# Altium schematic symbol library IC_ADI.SCHLIB: 3169 symbols (part 129 of 181) (continued)
## AD8522AR (continued)

## AD8522ARZ
designator U?
Dual 12-Bit Digital-to-Analog Converter with Serial Interface, 5 V, -40 to +85 degC, R-14, Pb-Free, Tube; Generic Part Number: AD8522; PartNumber: AD8522ARZ; # DAC Outputs: 2; Max V+: 5.5V; Op Pwr Diss: 25mW; Resolution (Bits): 12; Settling Time: 16祍; Single Supply: Yes; DatasheetVersion: Rev.A; PackageVersion: 060606-A; PackageReference: R-14; PackageDescription: 14-Lead Standard Small Outline Package [SOIC_N]; Supplier Part Number 1: AD8522ARZ-ND; Supplier Part Number 2: 2305694; Supplier Part Number 3: 59K6799; Supplier Part Number 4: 584-AD8522ARZ; Packing: Tube; RoHS: Y; Mounting Technology: Surface Mount; Code_JEDEC: MS-012-AB; Code_IPC: SOIC127P600-14; ComponentLink1Description: Manufacturer URL; ComponentLink2Description: Datasheet; ComponentLink3Description: Package Specification; ComponentLink4Description: Product URL
footprint SOIC14_1.27 (Footprint not found)
pins: 1 VOUTA (out) "DAC A voltage outputs, 4.095 V full scale, +/-5 mA output.", 2 AGND (power) "Analog Ground Input.", 3 DGND (power) "Digital Ground Input.", 4 ~{CS} (in) "Chip Select, active low input. Prevents shift register loading when high. Does not affect L\D\A\ and L\D\B\ operation.", 5 CLK (in) "Clock input, positive edge clocks data into shift register.", 6 SDI (in) "Serial Data Input, input data loads directly into the shift register.", 7 SDO (out) "Serial Data Output. Output of shift register, always active.", 8 ~{LDB} (in) "Load DAC register strobes, active low. Transfers shift register data to DAC register. See truth table for operation.Software decode feature only requires one L\D\ strobe. Tie L\D\A\ and L\D\B\ together or use one of them (See Datasheet)", 9 ~{LDA} (in) "Load DAC register strobes, active low. Transfers shift register data to DAC register. See truth table for operation.Software decode feature only requires one L\D\ strobe. Tie L\D\A\ and L\D\B\ together or use one of them (See Datasheet)", 10 ~{RS} (in) "Resets DAC registers to condition determined by MSB pin. Active low input.", 11 MSB (in) "Digital input: High presets DAC registers to half scale (800H); Low clears all registers to zero (000H), when R\S\ is strobed to active low.", 12 VDD (power) "Positive +5 V power supply input. Tolerance +/-10%.", 13 VREF (out) "Reference Voltage Output, 2.5 V nominal.", 14 VOUTB (out) "DAC B voltage outputs, 4.095 V full scale, +/-5 mA output."

## AD8531AKSZ-R2
designator U?
Single Channel RRIO Operational Amplifier, 3 MHz BW, 5 V/us SR, Industrial, 5-pin SOT23 (KS-5), Reel; Generic Part Number: AD8531; PartNumber: AD8531AKSZ-R2; Amplifiers Per Package: 1; Input Bias Current: 5pA; Input Offset Voltage: 25mV; Iq/Amp: 1.25mA; Slew Rate: 5V/us; Small Signal Bandwidth: 3MHz; V Span Max: 6V; V Span Min: 2.7V; DatasheetVersion: Rev. F; PackageVersion: 072809-A; PackageReference: KS-5; PackageDescription: 5-Pin Thin Shrink Small Outline Transistor Package, Body 2 x 1.25 mm, Pitch 0.65 mm; Supplier Part Number 1: AD8531AKSZ-R2-ND; Supplier Part Number 2: 59K6810; Packing: Reel; Mounting Technology: Surface Mount; Code_JEDEC: MO-203-AA; ComponentLink1Description: Manufacturer URL; ComponentLink2Description: Datasheet; ComponentLink3Description: Package Specification
footprint SOT353 (Footprint not found)
pins: 1 OUT A (out), 2 -V (power), 3 +IN A (in), 4 -IN A (in), 5 +V (power)

## AD8532AR
designator U?
Double Channel Rail-to-Rail Operational Amplifier, 3 MHz BW, 5 V/us SR, Industrial, 8-pin SOIC (R-8), Tube; Generic Part Number: AD8532; PartNumber: AD8532AR; Amplifiers Per Package: 2; Input Bias Current: 5pA; Input Offset Voltage: 25mV; Iq/Amp: 1.25mA; Slew Rate: 5V/us; Small Signal Bandwidth: 3MHz; V Span Max: 6V; V Span Min: 3V; DatasheetVersion: Rev. F; PackageVersion: 060506-A; PackageReference: R-8; PackageDescription: 8-Pin Standard Small Outline Package, Body 3.9 x 4.9 mm, Pitch 1.27 mm; Supplier Part Number 1: AD8532AR-ND; Mounting Technology: Surface Mount; Code_JEDEC: MS-012-AA; ComponentLink1Description: Manufacturer URL; ComponentLink2Description: Datasheet; ComponentLink3Description: Package Specification
footprint SOIC8_1.27 (Footprint not found)
pins on every part: 4 -V (power), 8 +V (power)
part A pins: 1 OUT A (out), 2 -IN A (in), 3 +IN A (in)
part B pins: 5 +IN B (in), 6 -IN B (in), 7 OUT B (out)

## AD8532ARMZ-R2
designator U?
Double Channel Rail-to-Rail Operational Amplifier, 3 MHz BW, 5 V/us SR, Industrial, 8-pin SOP (RM-8), Reel; Generic Part Number: AD8532; PartNumber: AD8532ARMZ-R2; Amplifiers Per Package: 2; Input Bias Current: 5pA; Input Offset Voltage: 25mV; Iq/Amp: 1.25mA; Slew Rate: 5V/us; Small Signal Bandwidth: 3MHz; V Span Max: 6V; V Span Min: 3V; DatasheetVersion: Rev. F; PackageReference: RM-8; PackageDescription: 8-Pin Mini Small Outline Package, Body 3 x 3 mm, Pitch 0.65 mm; Supplier Part Number 1: AD8532ARMZ-R2TR-ND; Supplier Part Number 2: AD8532ARMZ-R2CT-ND; Supplier Part Number 3: AD8532ARMZ-R2DKR-ND; Supplier Part Number 4: 1699534; Supplier Part Number 5: 12M9106; Mounting Technology: Surface Mount; Code_JEDEC: MO-187-AA; ComponentLink1Description: Manufacturer URL; ComponentLink2Description: Datasheet; ComponentLink3Description: Package Specification
footprint VSSOP8_0.65 (Footprint not found)
pins on every part: 4 -V (power), 8 +V (power)
part A pins: 1 OUT A (out), 2 -IN A (in), 3 +IN A (in)
part B pins: 5 +IN B (in), 6 -IN B (in), 7 OUT B (out)

## AD8538AUJZ-R2
designator U?
Single Channel Single-Supply Operation Operational Amplifier, 430 KHz BW, 400 mV/us SR, Industrial, 5-pin SOT23 (UJ-5), Reel; Generic Part Number: AD8538; PartNumber: AD8538AUJZ-R2; Amplifiers Per Package: 1; Input Bias Current: 15pA; Input Offset Voltage: 5uV; Iq/Amp: 180uA; Small Signal Bandwidth: 430KHz; V Span Max: 5.5V; V Span Min: 2.7V; DatasheetVersion: Rev. A; PackageVersion: 100708-A; PackageReference: UJ-5; PackageDescription: 5-Pin Thin Small Outline Transistor Package, Body 2.9 x 1.6 mm, Pitch 0.95 mm; Supplier Part Number 1: AD8538AUJZ-R2-ND; Supplier Part Number 2: 1699535; Supplier Part Number 3: 12M9112; Slew Rate: 400mV/us; Mounting Technology: Surface Mount; Code_JEDEC: MO-193-AB; ComponentLink1Description: Manufacturer URL; ComponentLink2Description: Datasheet; ComponentLink3Description: Package Specification
footprint SOT23-5 (Footprint not found)
pins: 1 OUT (out), 2 -V (power), 3 +IN (in), 4 -IN (in), 5 +V (power)

## AD8541AKSZ-R2
designator U?
Single Channel RRIO Operational Amplifier, 1 MHz BW, 920 mV/us SR, Industrial, 5-pin SOT23 (KS-5), Reel; Generic Part Number: AD8541; PartNumber: AD8541AKSZ-R2; Amplifiers Per Package: 1; Input Bias Current: 4pA; Input Offset Voltage: 1mV; Iq/Amp: 65uA; Small Signal Bandwidth: 1MHz; V Span Max: 5.5V; V Span Min: 2.7V; DatasheetVersion: Rev. G; PackageVersion: 072809-A; PackageReference: KS-5; PackageDescription: 5-Pin Thin Shrink Small Outline Transistor Package, Body 2 x 1.25 mm, Pitch 0.65 mm; Supplier Part Number 1: AD8541AKSZ-R2TR-ND; Supplier Part Number 2: AD8541AKSZ-R2CT-ND; Supplier Part Number 3: AD8541AKSZ-R2DKR-ND; Supplier Part Number 4: 1837433; Supplier Part Number 5: 59K6819; Slew Rate: 920mV/us; Mounting Technology: Surface Mount; Code_JEDEC: MO-203-AA; ComponentLink1Description: Manufacturer URL; ComponentLink2Description: Datasheet; ComponentLink3Description: Package Specification; ComponentLink4Description: Reference Circuit
footprint SOT353 (Footprint not found)
pins: 1 OUT A (out), 2 -V (power), 3 +IN A (in), 4 -IN A (in), 5 +V (power)

## AD8541ARTZ-R2
designator U?
Single Channel RRIO Operational Amplifier, 1 MHz BW, 920 mV/us SR, Industrial, 5-pin SOT23 (RJ-5), Reel; Generic Part Number: AD8541; PartNumber: AD8541ARTZ-R2; Amplifiers Per Package: 1; Input Bias Current: 4pA; Input Offset Voltage: 1mV; Iq/Amp: 65uA; Small Signal Bandwidth: 1MHz; V Span Max: 5.5V; V Span Min: 2.7V; DatasheetVersion: Rev. G; PackageVersion: 121608-A; PackageReference: RJ-5; PackageDescription: 5-Pin Small Outline Transistor Package, Body 2.9 x 1.6 mm, Pitch 0.95 mm; Supplier Part Number 1: AD8541ARTZ-R2TR-ND; Supplier Part Number 2: AD8541ARTZ-R2CT-ND; Supplier Part Number 3: AD8541ARTZ-R2DKR-ND; Supplier Part Number 4: 1837434; Supplier Part Number 5: 59K6820; Slew Rate: 920mV/us; Mounting Technology: Surface Mount; Code_JEDEC: MO-178-AA; ComponentLink1Description: Manufacturer URL; ComponentLink2Description: Datasheet; ComponentLink3Description: Package Specification; ComponentLink4Description: Reference Circuit
footprint SOT23-5 (Footprint not found)
pins: 1 OUT A (out), 2 -V (power), 3 +IN A (in), 4 -IN A (in), 5 +V (power)

## AD8542ARMZ
designator U?
Double Channel RRIO Operational Amplifier, 1 MHz BW, 920 mV/us SR, Industrial, 8-pin SOP (RM-8), Tube; Generic Part Number: AD8542; PartNumber: AD8542ARMZ; Amplifiers Per Package: 2; Input Bias Current: 4pA; Input Offset Voltage: 1mV; Iq/Amp: 65uA; Small Signal Bandwidth: 1MHz; V Span Max: 5.5V; V Span Min: 2.7V; DatasheetVersion: Rev. G; PackageReference: RM-8; PackageDescription: 8-Pin Mini Small Outline Package, Body 3 x 3 mm, Pitch 0.65 mm; Supplier Part Number 1: AD8542ARMZ-ND; Supplier Part Number 2: 34P3244; Slew Rate: 920mV/us; Mounting Technology: Surface Mount; Code_JEDEC: MO-187-AA; ComponentLink1Description: Manufacturer URL; ComponentLink2Description: Datasheet; ComponentLink3Description: Package Specification
footprint VSSOP8_0.65 (Footprint not found)
pins on every part: 4 -V (power), 8 +V (power)
part A pins: 1 OUT A (out), 2 -IN A (in), 3 +IN A (in)
part B pins: 5 +IN B (in), 6 -IN B (in), 7 OUT B (out)

## AD8551ARMZ
designator U?
Single Channel Rail-to-Rail Operational Amplifier, 1.5 MHz BW, 400 mV/us SR, Industrial, 8-pin SOP (RM-8), Tube; Generic Part Number: AD8551; PartNumber: AD8551ARMZ; Amplifiers Per Package: 1; Input Bias Current: 10pA; Input Offset Voltage: 1uV; Iq/Amp: 975礎; Small Signal Bandwidth: 1.5MHz; V Span Max: 6V; V Span Min: 2.7V; DatasheetVersion: Rev. E; PackageReference: RM-8; PackageDescription: 8-Pin Mini Small Outline Package, Body 3 x 3 mm, Pitch 0.65 mm; Supplier Part Number 1: AD8551ARMZ-ND; Supplier Part Number 2: 19P8302; Slew Rate: 400mV/us; Mounting Technology: Surface Mount; Code_JEDEC: MO-187-AA; ComponentLink1Description: Manufacturer URL; ComponentLink2Description: Datasheet; ComponentLink3Description: Package Specification
footprint VSSOP8_0.65 (Footprint not found)
part A pins: 2 -IN A (in), 3 +IN A (in), 4 -V (power), 6 OUT A (out), 7 +V (power)
part B pins: 1 NC, 5 NC, 8 NC

## AD8552AR
designator U?
Double Channel Rail-to-Rail Operational Amplifier, 1.5 MHz BW, 400 mV/us SR, Industrial, 8-pin SOIC (R-8), Tube; Generic Part Number: AD8552; PartNumber: AD8552AR; Amplifiers Per Package: 2; Input Bias Current: 10pA; Input Offset Voltage: 1uV; Iq/Amp: 975uA; Small Signal Bandwidth: 1.5MHz; V Span Max: 5.5V; V Span Min: 2.7V; DatasheetVersion: Rev. E; PackageVersion: 060506-A; PackageReference: R-8; PackageDescription: 8-Pin Standard Small Outline Package, Body 3.9 x 4.9 mm, Pitch 1.27 mm; Supplier Part Number 1: AD8552AR-ND; Slew Rate: 400mV/us; Mounting Technology: Surface Mount; Code_JEDEC: MS-012-AA; ComponentLink1Description: Manufacturer URL; ComponentLink2Description: Datasheet; ComponentLink3Description: Package Specification
footprint SOIC8_1.27 (Footprint not found)
pins on every part: 4 -V (power), 8 +V (power)
part A pins: 1 OUT A (out), 2 -IN A (in), 3 +IN A (in)
part B pins: 5 +IN B (in), 6 -IN B (in), 7 OUT B (out)

## AD8552ARU
designator U?
Double Channel Rail-to-Rail Operational Amplifier, 1.5 MHz BW, 400 mV/us SR, Industrial, 8-pin SOP (RU-8), Tube; Generic Part Number: AD8552; PartNumber: AD8552ARU; Amplifiers Per Package: 2; Input Bias Current: 10pA; Input Offset Voltage: 1uV; Iq/Amp: 975uA; Small Signal Bandwidth: 1.5MHz; V Span Max: 5.5V; V Span Min: 2.7V; DatasheetVersion: Rev. E; PackageReference: RU-8; PackageDescription: 8-Pin Thin Shrink Small Outline Package, Body 3 x 4.4 mm, Pitch 0.65 mm; Supplier Part Number 1: AD8552ARU-ND; Slew Rate: 400mV/us; Mounting Technology: Surface Mount; Code_JEDEC: MO-153AA; ComponentLink1Description: Manufacturer URL; ComponentLink2Description: Datasheet; ComponentLink3Description: Package Specification
footprint TSSOP8_0.65 (Footprint not found)
pins on every part: 4 -V (power), 8 +V (power)
part A pins: 1 OUT A (out), 2 -IN A (in), 3 +IN A (in)
part B pins: 5 +IN B (in), 6 -IN B (in), 7 OUT B (out)

## AD8561AN
designator U?
Ultrafast Single Supply Comparator, 5 V, 7 ns Delay, Industrial, 8-pin DIP (N-8), Tube; PartNumber: AD8561AN; Input Range (V): -5 to 3; Total Power (mW): 65mW; Voltage Supply (V): +/- 5; DatasheetVersion: Rev. 0; PackageVersion: 070606-A, 07/2006; PackageReference: N-8; PackageDescription: 8-Pin Plastic Dual In-Line Package, Row spacing 7.62 mm, Pitch 2.54 mm; Supplier Part Number 1: AD8561AN-ND; Supplier Part Number 2: N/A; Packing: Tube; Mounting Technology: Through Hole; Code_JEDEC: MS-001; ComponentLink1Description: Manufacturer URL; ComponentLink2Description: Datasheet; ComponentLink3Description: Package Specification; ComponentLink4Description: URL Link1
footprint DIP8 (Footprint not found)
pins: 1 V+ (power), 2 +IN (in), 3 -IN (in), 4 V- (power), 5 LATCH (in), 6 GND (power), 7 OUT (out), 8 ~{OUT} (out)

## AD8561AR
designator U?
Ultrafast Single Supply Comparator, 5 V, 7 ns Delay, Industrial, 8-pin SOIC (R-8), Tube; PartNumber: AD8561AR; Input Range (V): -5 to 3; Total Power (mW): 65mW; Voltage Supply (V): +/- 5; DatasheetVersion: Rev. 0; PackageVersion: 060506-A, 06/2006; PackageReference: R-8; PackageDescription: 8-Pin Standard Small Outline Package, Body 4.9 x 3.9 mm, Pitch 1.27 mm; Supplier Part Number 1: AD8561AR-ND; Supplier Part Number 2: 584-AD8561AR; Packing: Tube; Mounting Technology: Surface Mount; Code_JEDEC: MS-012-AA; ComponentLink1Description: Manufacturer URL; ComponentLink2Description: Datasheet; ComponentLink3Description: Package Specification; ComponentLink4Description: URL Link1
footprint SOIC8_1.27 (Footprint not found)
pins: 1 V+ (power), 2 +IN (in), 3 -IN (in), 4 V- (power), 5 LATCH (in), 6 GND (power), 7 OUT (out), 8 ~{OUT} (out)

## AD8561ARUZ
designator U?
Ultrafast Single Supply Comparator, 5 V, 7 ns Delay, Industrial, 8-pin SOP (RU-8), Tube; PartNumber: AD8561ARUZ; Input Range (V): -5 to 3; Total Power (mW): 65mW; Voltage Supply (V): +/- 5; DatasheetVersion: Rev. 0; PackageVersion: Jan-03; PackageReference: RU-8; PackageDescription: 8-Pin Thin Shrink Small Outline Package, Body 3 x 4.4 mm, Pitch 0.65 mm; Supplier Part Number 1: AD8561ARUZ-ND; Supplier Part Number 2: 2305660; Supplier Part Number 3: 584-AD8561ARUZ; Packing: Tube; Mounting Technology: Surface Mount; Code_JEDEC: MO-153AA; ComponentLink1Description: Manufacturer URL; ComponentLink2Description: Datasheet; ComponentLink3Description: Package Specification; ComponentLink4Description: URL Link1
footprint TSSOP8_0.65 (Footprint not found)
pins: 1 V+ (power), 2 +IN (in), 3 -IN (in), 4 V- (power), 5 LATCH (in), 6 GND (power), 7 OUT (out), 8 ~{OUT} (out)

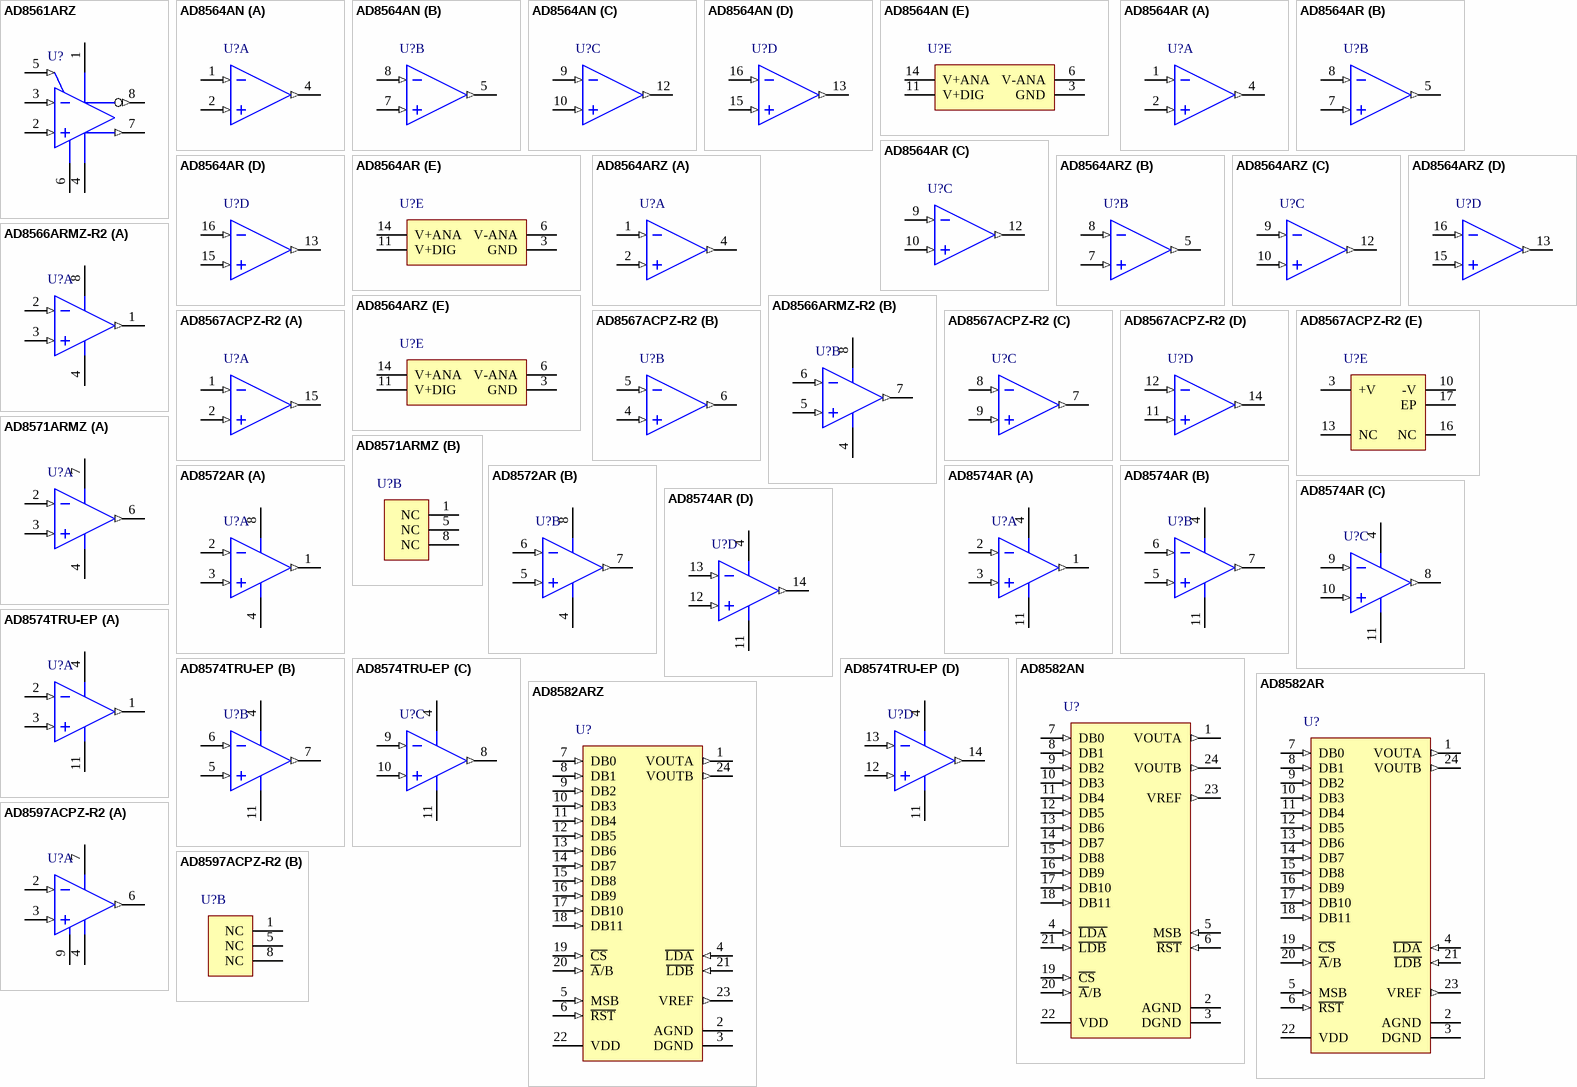
[diagram p96: symbols AD8561ARZ to AD8597ACPZ-R2]

## AD8561ARZ
designator U?
Ultrafast Single Supply Comparator, 5 V, 7 ns Delay, Industrial, 8-pin SOIC (R-8), Tube; PartNumber: AD8561ARZ; Input Range (V): -5 to 3; Total Power (mW): 65mW; Voltage Supply (V): +/- 5; DatasheetVersion: Rev. 0; PackageVersion: 060506-A, 06/2006; PackageReference: R-8; PackageDescription: 8-Pin Standard Small Outline Package, Body 4.9 x 3.9 mm, Pitch 1.27 mm; Supplier Part Number 1: AD8561ARZ-ND; Supplier Part Number 2: 1661043; Supplier Part Number 3: 584-AD8561ARZ; Packing: Tube; Mounting Technology: Surface Mount; Code_JEDEC: MS-012-AA; ComponentLink1Description: Manufacturer URL; ComponentLink2Description: Datasheet; ComponentLink3Description: Package Specification; ComponentLink4Description: URL Link1
footprint SOIC8_1.27 (Footprint not found)
pins: 1 V+ (power), 2 +IN (in), 3 -IN (in), 4 V- (power), 5 LATCH (in), 6 GND (power), 7 OUT (out), 8 ~{OUT} (out)

## AD8564AN
designator U?
Quad Single Supply Comparator, 5 V, 7 ns Delay, Industrial, 16-pin DIP (N-16), Tube; PartNumber: AD8564AN; Input Range (V): -4.9 to 3.5; Total Power (mW): 150mW; Voltage Supply (V): +/- 5; DatasheetVersion: Rev. B; PackageVersion: 070706-A, 07/2006; PackageReference: N-16; PackageDescription: 16-Pin Plastic Dual In-Line Package, Row spacing 7.62 mm, Pitch 2.54 mm; Supplier Part Number 1: AD8564AN-ND; Supplier Part Number 2: N/A; Packing: Tube; Mounting Technology: Through Hole; Code_JEDEC: MS-001; ComponentLink1Description: Manufacturer URL; ComponentLink2Description: Datasheet; ComponentLink3Description: Package Specification; ComponentLink4Description: URL Link1
footprint DIP16 (Footprint not found)
part A pins: 1 -INA (in), 2 +INA (in), 4 OUT A (out)
part B pins: 5 OUT B (out), 7 +INB (in), 8 -INB (in)
part C pins: 9 -INC (in), 10 +INC (in), 12 OUT C (out)
part D pins: 13 OUT D (out), 15 +IND (in), 16 -IND (in)
part E pins: 3 GND (power), 6 V-ANA (power), 11 V+DIG (power), 14 V+ANA (power)

## AD8564AR
designator U?
Quad Single Supply Comparator, 5 V, 7 ns Delay, Industrial, 16-pin SOIC (R-16), Tube; PartNumber: AD8564AR; Input Range (V): -4.9 to 3.5; Total Power (mW): 150mW; Voltage Supply (V): +/- 5; DatasheetVersion: Rev. B; PackageVersion: 060606-A, 06/2006; PackageReference: R-16; PackageDescription: 16-Pin Standard Small Outline Package, Body 9.9 x 3.9 mm, Pitch 1.27 mm; Supplier Part Number 1: AD8564AR-ND; Supplier Part Number 2: 584-AD8564AR; Packing: Tube; Mounting Technology: Surface Mount; Code_JEDEC: MS-012-AC; ComponentLink1Description: Manufacturer URL; ComponentLink2Description: Datasheet; ComponentLink3Description: Package Specification; ComponentLink4Description: URL Link1
footprint SOIC16_1.27 (Footprint not found)
part A pins: 1 -INA (in), 2 +INA (in), 4 OUT A (out)
part B pins: 5 OUT B (out), 7 +INB (in), 8 -INB (in)
part C pins: 9 -INC (in), 10 +INC (in), 12 OUT C (out)
part D pins: 13 OUT D (out), 15 +IND (in), 16 -IND (in)
part E pins: 3 GND (power), 6 V-ANA (power), 11 V+DIG (power), 14 V+ANA (power)

## AD8564ARZ
designator U?
Quad Single Supply Comparator, 5 V, 7 ns Delay, Industrial, 16-pin SOIC (R-16), Tube; PartNumber: AD8564ARZ; Input Range (V): -4.9 to 3.5; Total Power (mW): 150mW; Voltage Supply (V): +/- 5; DatasheetVersion: Rev. B; PackageVersion: 060606-A, 06/2006; PackageReference: R-16; PackageDescription: 16-Pin Standard Small Outline Package, Body 9.9 x 3.9 mm, Pitch 1.27 mm; Supplier Part Number 1: AD8564ARZ-ND; Supplier Part Number 2: 1661044; Supplier Part Number 3: 584-AD8564ARZ; Packing: Tube; Mounting Technology: Surface Mount; Code_JEDEC: MS-012-AC; ComponentLink1Description: Manufacturer URL; ComponentLink2Description: Datasheet; ComponentLink3Description: Package Specification; ComponentLink4Description: URL Link1
footprint SOIC16_1.27 (Footprint not found)
part A pins: 1 -INA (in), 2 +INA (in), 4 OUT A (out)
part B pins: 5 OUT B (out), 7 +INB (in), 8 -INB (in)
part C pins: 9 -INC (in), 10 +INC (in), 12 OUT C (out)
part D pins: 13 OUT D (out), 15 +IND (in), 16 -IND (in)
part E pins: 3 GND (power), 6 V-ANA (power), 11 V+DIG (power), 14 V+ANA (power)

## AD8566ARMZ-R2
designator U?
Double Channel Single-Supply Operation Operational Amplifier, 5 MHz BW, 6 V/us SR, Industrial, 8-pin SOP (RM-8), Reel; Generic Part Number: AD8566; PartNumber: AD8566ARMZ-R2; Amplifiers Per Package: 2; Automotive Qualified: Yes; Input Bias Current: 600nA; Input Offset Voltage: 2mV; Iq/Amp: 850uA; Slew Rate: 6V/us; Small Signal Bandwidth: 5MHz; V Span Max: 16V; V Span Min: 4.5V; DatasheetVersion: Rev. G; PackageReference: RM-8; PackageDescription: 8-Pin Mini Small Outline Package, Body 3 x 3 mm, Pitch 0.65 mm; Supplier Part Number 1: AD8566ARMZ-R2TR-ND; Supplier Part Number 2: AD8566ARMZ-R2CT-ND; Supplier Part Number 3: AD8566ARMZ-R2DKR-ND; Supplier Part Number 4: 12M9118; Mounting Technology: Surface Mount; Code_JEDEC: MO-187-AA; ComponentLink1Description: Manufacturer URL; ComponentLink2Description: Datasheet; ComponentLink3Description: Package Specification
footprint VSSOP8_0.65 (Footprint not found)
pins on every part: 4 -V (power), 8 +V (power)
part A pins: 1 OUT A (out), 2 -IN A (in), 3 +IN A (in)
part B pins: 5 +IN B (in), 6 -IN B (in), 7 OUT B (out)

## AD8567ACPZ-R2
designator U?
Quad Channel Rail-to-Rail Operational Amplifier, 5 MHz BW, 6 V/us SR, Industrial, 16-pin QFN (CP-16-4), Reel; Generic Part Number: AD8567; PartNumber: AD8567ACPZ-R2; Amplifiers Per Package: 4; Input Bias Current: 80nA; Input Offset Voltage: 2mV; Iq/Amp: 850礎; Slew Rate: 6V/us; Small Signal Bandwidth: 5MHz; V Span Max: 16V; V Span Min: 4.5V; DatasheetVersion: Rev. G; PackageVersion: 010606-0; PackageReference: CP-16-4; PackageDescription: 16-Pin Lead Frame Chip Scale Package, Body 4 x 4 mm, Pitch 0.65 mm; Supplier Part Number 1: AD8567ACPZ-R2-ND; Supplier Part Number 2: 59K6867; Mounting Technology: Surface Mount; Code_JEDEC: MO-220-VGGC; ComponentLink1Description: Manufacturer URL; ComponentLink2Description: Datasheet; ComponentLink3Description: Package Specification
footprint QFN16_0.65-PAD(4x4) (Footprint not found)
part A pins: 1 -IN A (in), 2 +IN A (in), 15 OUT A (out)
part B pins: 4 +IN B (in), 5 -IN B (in), 6 OUT B (out)
part C pins: 7 OUT C (out), 8 -IN C (in), 9 +IN C (in)
part D pins: 11 +IN D (in), 12 -IN D (in), 14 OUT D (out)
part E pins: 3 +V (power), 10 -V (power), 13 NC, 16 NC, 17 EP (power) "IT IS RECOMMENDED TO CONNECT THE EXPOSED PAD TO V-."

## AD8571ARMZ
designator U?
Single Channel Rail-to-Rail Operational Amplifier, 1.5 MHz BW, 400 mV/us SR, Industrial, 8-pin SOP (RM-8), Tube; Generic Part Number: AD8571; PartNumber: AD8571ARMZ; Amplifiers Per Package: 1; Input Bias Current: 10pA; Input Offset Voltage: 1uV; Iq/Amp: 975礎; Small Signal Bandwidth: 1.5MHz; V Span Max: 6V; V Span Min: 2.7V; DatasheetVersion: Rev. E; PackageReference: RM-8; PackageDescription: 8-Pin Mini Small Outline Package, Body 3 x 3 mm, Pitch 0.65 mm; Supplier Part Number 1: AD8571ARMZ-ND; Slew Rate: 400mV/us; Mounting Technology: Surface Mount; Code_JEDEC: MO-187-AA; ComponentLink1Description: Manufacturer URL; ComponentLink2Description: Datasheet; ComponentLink3Description: Package Specification
footprint VSSOP8_0.65 (Footprint not found)
part A pins: 2 -IN A (in), 3 +IN A (in), 4 -V (power), 6 OUT A (out), 7 +V (power)
part B pins: 1 NC, 5 NC, 8 NC

## AD8572AR
designator U?
Double Channel Rail-to-Rail Operational Amplifier, 1.5 MHz BW, 400 mV/us SR, Industrial, 8-pin SOIC (R-8), Tube; Generic Part Number: AD8572; PartNumber: AD8572AR; Amplifiers Per Package: 2; Input Bias Current: 10pA; Input Offset Voltage: 1uV; Iq/Amp: 975uA; Small Signal Bandwidth: 1.5MHz; V Span Max: 6V; V Span Min: 2.7V; DatasheetVersion: Rev. E; PackageVersion: 060506-A; PackageReference: R-8; PackageDescription: 8-Pin Standard Small Outline Package, Body 3.9 x 4.9 mm, Pitch 1.27 mm; Supplier Part Number 1: AD8572AR-ND; Slew Rate: 400mV/us; Mounting Technology: Surface Mount; Code_JEDEC: MS-012-AA; ComponentLink1Description: Manufacturer URL; ComponentLink2Description: Datasheet; ComponentLink3Description: Package Specification
footprint SOIC8_1.27 (Footprint not found)
pins on every part: 4 -V (power), 8 +V (power)
part A pins: 1 OUT A (out), 2 -IN A (in), 3 +IN A (in)
part B pins: 5 +IN B (in), 6 -IN B (in), 7 OUT B (out)

## AD8574AR
designator U?
Quad Channel Rail-to-Rail Operational Amplifier, 1.5 MHz BW, 400 mV/us SR, Industrial, 14-pin SOIC (R-14), Tube; Generic Part Number: AD8574; PartNumber: AD8574AR; Amplifiers Per Package: 4; Input Bias Current: 10pA; Input Offset Voltage: 1uV; Iq/Amp: 975uA; Small Signal Bandwidth: 1.5MHz; V Span Max: 6V; V Span Min: 2.7V; DatasheetVersion: Rev. E; PackageVersion: 060606-A; PackageReference: R-14; PackageDescription: 14-Pin Standard Small Outline Package, Body 8.65 x 3.9 mm, Pitch 1.27 mm; Supplier Part Number 1: AD8574AR-ND; Slew Rate: 400mV/us; Mounting Technology: Surface Mount; Code_JEDEC: MS-012-AB; ComponentLink1Description: Manufacturer URL; ComponentLink2Description: Datasheet; ComponentLink3Description: Package Specification
footprint SOIC14_1.27 (Footprint not found)
pins on every part: 4 +V (power), 11 -V (power)
part A pins: 1 OUT A (out), 2 -IN A (in), 3 +IN A (in)
part B pins: 5 +IN B (in), 6 -IN B (in), 7 OUT B (out)
part C pins: 8 OUT C (out), 9 -IN C (in), 10 +IN C (in)
part D pins: 12 +IN D (in), 13 -IN D (in), 14 OUT D (out)

## AD8574TRU-EP
designator U?
Quad Channel RRIO Operational Amplifier, 1.5 MHz BW, 400 mV/us SR, Military, 14-pin SOP (RU-14), Tube; Generic Part Number: AD8574; PartNumber: AD8574TRU-EP; Amplifiers Per Package: 4; Input Bias Current: 10pA; Input Offset Voltage: 1uV; Iq/Amp: 975uA; Small Signal Bandwidth: 1.5MHz; V Span Max: 6V; V Span Min: 2.7V; DatasheetVersion: Rev. E; PackageReference: RU-14; PackageDescription: 14-Pin Thin Shrink Small Outline Package, Body 5 x 4.4 mm, Pitch 0.65 mm; Supplier Part Number 1: AD8574TRU-EP-ND; Supplier Part Number 2: 45T0238; Slew Rate: 400mV/us; Mounting Technology: Surface Mount; Code_JEDEC: MO-153AB-1; ComponentLink1Description: Manufacturer URL; ComponentLink2Description: Datasheet; ComponentLink3Description: Package Specification
footprint TSSOP14_0.65 (Footprint not found)
pins on every part: 4 +V (power), 11 -V (power)
part A pins: 1 OUT A (out), 2 -IN A (in), 3 +IN A (in)
part B pins: 5 +IN B (in), 6 -IN B (in), 7 OUT B (out)
part C pins: 8 OUT C (out), 9 -IN C (in), 10 +IN C (in)
part D pins: 12 +IN D (in), 13 -IN D (in), 14 OUT D (out)

## AD8582AN
designator U?
Dual 12-Bit Digital-to-Analog Converter with Parallel Interface, 5 V, -40 to +85 degC, N-24-1, Tube; Generic Part Number: AD8582; PartNumber: AD8582AN; # DAC Outputs: 2; Max V+: 5.25V; Op Pwr Diss: 35mW; Resolution (Bits): 12; Settling Time: 16祍; Single Supply: Yes; DatasheetVersion: Rev.0; PackageVersion: 071006-A; PackageReference: N-24-1; PackageDescription: 24-Lead Plastic Dual In-Line Package [PDIP] Narrow Body; Supplier Part Number 1: AD8582AN-ND; Supplier Part Number 2: 584-AD8582AN; Packing: Tube; RoHS: N; Mounting Technology: Through Hole; Code_JEDEC: MS-001; ComponentLink1Description: Manufacturer URL; ComponentLink2Description: Datasheet; ComponentLink3Description: Package Specification; ComponentLink4Description: Product URL
footprint DIP24 (Footprint not found)
pins: 1 VOUTA (out) "Voltage outputs from the DACs. Fixed output voltage range of 0 V to 4.095 V with 1 mV/LSB. An internal temperature stabilized reference maintains a fixed full-scale voltage independent of time, temperature and power supply (See Datasheet)", 2 AGND (power) "Analog Ground. Ground reference for the internal bandgap reference voltage, the DAC, and the output buffer.", 3 DGND (power) "Digital ground for input logic.", 4 ~{LDA} (in) "Load DAC register strobes. Transfers input register data to the DAC registers. Active low inputs, Level sensitive latch. May be connected together to doublebuffer load DAC registers.", 5 MSB (in) "Digital Input: High presets DAC registers to half scale (800H), Low clears DAC registers to zero (000H) upon R\S\T\ assertion.", 6 ~{RST} (in) "Active low digital input that clears the DAC register to zero, setting the DAC to minimum scale when MSB pin = 0, or half-scale when MSB pin = 1.", 7 DB0 (in) "Binary Data Bit Input. DB0 is the LSB.", 8 DB1 (in) "Binary Data Bit Input.", 9 DB2 (in) "Binary Data Bit Input.", 10 DB3 (in) "Binary Data Bit Input.", 11 DB4 (in) "Binary Data Bit Input.", 12 DB5 (in) "Binary Data Bit Input.", 13 DB6 (in) "Binary Data Bit Input.", 14 DB7 (in) "Binary Data Bit Input.", 15 DB8 (in) "Binary Data Bit Input.", 16 DB9 (in) "Binary Data Bit Input.", 17 DB10 (in) "Binary Data Bit Input.", 18 DB11 (in) "Binary Data Bit Input.DB11 is the MSB .", 19 ~{CS} (in) "Chip Select. Active low input.", 20 ~{A}/B (in) "Select DAC A = 0 or DAC B = 1.", 21 ~{LDB} (in) "Load DAC register strobes. Transfers input register data to the DAC registers. Active low inputs, Level sensitive latch. May be connected together to doublebuffer load DAC registers.", 22 VDD (power) "Positive Supply. Nominal value +5 V, +/-5%.", 23 VREF (out) "Nominal 2.5 V reference output voltage. This node must be buffered if required to drive external loads.", 24 VOUTB (out) "Voltage outputs from the DACs. Fixed output voltage range of 0 V to 4.095 V with 1 mV/LSB. An internal temperature stabilized reference maintains a fixed full-scale voltage independent of time, temperature and power supply (See Datasheet)"

## AD8582AR
designator U?
Dual 12-Bit Digital-to-Analog Converter with Parallel Interface, 5 V, -40 to +85 degC, RW-24, Tube; Generic Part Number: AD8582; PartNumber: AD8582AR; # DAC Outputs: 2; Max V+: 5.25V; Op Pwr Diss: 35mW; Resolution (Bits): 12; Settling Time: 16祍; Single Supply: Yes; DatasheetVersion: Rev.0; PackageVersion: 060706-A; PackageReference: RW-24; PackageDescription: 24-Lead Standard Small Outline Package [SOIC_W]; Supplier Part Number 1: AD8582AR-ND; Supplier Part Number 2: 584-AD8582AR; Packing: Tube; RoHS: N; Mounting Technology: Surface Mount; Code_JEDEC: MS-013-AD; ComponentLink1Description: Manufacturer URL; ComponentLink2Description: Datasheet; ComponentLink3Description: Package Specification; ComponentLink4Description: Product URL
footprint SOIC24W_1.27 (Footprint not found)
pins: 1 VOUTA (out) "Voltage outputs from the DACs. Fixed output voltage range of 0 V to 4.095 V with 1 mV/LSB. An internal temperature stabilized reference maintains a fixed full-scale voltage independent of time, temperature and power supply (See Datasheet)", 2 AGND (power) "Analog Ground. Ground reference for the internal bandgap reference voltage, the DAC, and the output buffer.", 3 DGND (power) "Digital ground for input logic.", 4 ~{LDA} (in) "Load DAC register strobes. Transfers input register data to the DAC registers. Active low inputs, Level sensitive latch. May be connected together to doublebuffer load DAC registers.", 5 MSB (in) "Digital Input: High presets DAC registers to half scale (800H), Low clears DAC registers to zero (000H) upon R\S\T\ assertion.", 6 ~{RST} (in) "Active low digital input that clears the DAC register to zero, setting the DAC to minimum scale when MSB pin = 0, or half-scale when MSB pin = 1.", 7 DB0 (in) "Twelve Binary Data Bit Input.  DB0 is the LSB.", 8 DB1 (in) "Twelve Binary Data Bit Input.", 9 DB2 (in) "Twelve Binary Data Bit Input.", 10 DB3 (in) "Twelve Binary Data Bit Input.", 11 DB4 (in) "Twelve Binary Data Bit Input.", 12 DB5 (in) "Twelve Binary Data Bit Input.", 13 DB6 (in) "Twelve Binary Data Bit Input.", 14 DB7 (in) "Twelve Binary Data Bit Input.", 15 DB8 (in) "Twelve Binary Data Bit Input.", 16 DB9 (in) "Twelve Binary Data Bit Input.", 17 DB10 (in) "Twelve Binary Data Bit Input.", 18 DB11 (in) "Twelve Binary Data Bit Input. DB11 is the MSB.", 19 ~{CS} (in) "Chip Select. Active low input.", 20 ~{A}/B (in) "Select DAC A = 0 or DAC B = 1.", 21 ~{LDB} (in) "Load DAC register strobes. Transfers input register data to the DAC registers. Active low inputs, Level sensitive latch. May be connected together to doublebuffer load DAC registers.", 22 VDD (power) "Positive Supply. Nominal value +5 V, +/-5%.", 23 VREF (out) "Nominal 2.5 V reference output voltage. This node must be buffered if required to drive external loads.", 24 VOUTB (out) "Voltage outputs from the DACs. Fixed output voltage range of 0 V to 4.095 V with 1 mV/LSB. An internal temperature stabilized reference maintains a fixed full-scale voltage independent of time, temperature and power supply (See Datasheet)"

## AD8582ARZ
designator U?
Dual 12-Bit Digital-to-Analog Converter with Parallel Interface, 5 V, -40 to +85 degC, RW-24, Pb-Free, Tube; Generic Part Number: AD8582; PartNumber: AD8582ARZ; # DAC Outputs: 2; Max V+: 5.25V; Op Pwr Diss: 35mW; Resolution (Bits): 12; Settling Time: 16祍; Single Supply: Yes; DatasheetVersion: Rev.0; PackageVersion: 060706-A; PackageReference: RW-24; PackageDescription: 24-Lead Standard Small Outline Package [SOIC_W]; Supplier Part Number 1: AD8582ARZ-ND; Supplier Part Number 2: 59K6880; Supplier Part Number 3: 584-AD8582ARZ; Packing: Tube; RoHS: Y; Mounting Technology: Surface Mount; Code_JEDEC: MS-013-AD; ComponentLink1Description: Manufacturer URL; ComponentLink2Description: Datasheet; ComponentLink3Description: Package Specification; ComponentLink4Description: Product URL
footprint SOIC24W_1.27 (Footprint not found)
pins: 1 VOUTA (out) "Voltage outputs from the DACs. Fixed output voltage range of 0 V to 4.095 V with 1 mV/LSB. An internal temperature stabilized reference maintains a fixed full-scale voltage independent of time, temperature and power supply (See Datasheet)", 2 AGND (power) "Analog Ground. Ground reference for the internal bandgap reference voltage, the DAC, and the output buffer.", 3 DGND (power) "Digital ground for input logic.", 4 ~{LDA} (in) "Load DAC register strobes. Transfers input register data to the DAC registers. Active low inputs, Level sensitive latch. May be connected together to doublebuffer load DAC registers.", 5 MSB (in) "Digital Input: High presets DAC registers to half scale (800H), Low clears DAC registers to zero (000H) upon R\S\T\ assertion.", 6 ~{RST} (in) "Active low digital input that clears the DAC register to zero, setting the DAC to minimum scale when MSB pin = 0, or half-scale when MSB pin = 1.", 7 DB0 (in) "Twelve Binary Data Bit Input.  DB0 is the LSB.", 8 DB1 (in) "Twelve Binary Data Bit Input.", 9 DB2 (in) "Twelve Binary Data Bit Input.", 10 DB3 (in) "Twelve Binary Data Bit Input.", 11 DB4 (in) "Twelve Binary Data Bit Input.", 12 DB5 (in) "Twelve Binary Data Bit Input.", 13 DB6 (in) "Twelve Binary Data Bit Input.", 14 DB7 (in) "Twelve Binary Data Bit Input.", 15 DB8 (in) "Twelve Binary Data Bit Input.", 16 DB9 (in) "Twelve Binary Data Bit Input.", 17 DB10 (in) "Twelve Binary Data Bit Input.", 18 DB11 (in) "Twelve Binary Data Bit Input. DB11 is the MSB.", 19 ~{CS} (in) "Chip Select. Active low input.", 20 ~{A}/B (in) "Select DAC A = 0 or DAC B = 1.", 21 ~{LDB} (in) "Load DAC register strobes. Transfers input register data to the DAC registers. Active low inputs, Level sensitive latch. May be connected together to doublebuffer load DAC registers.", 22 VDD (power) "Positive Supply. Nominal value +5 V, +/-5%.", 23 VREF (out) "Nominal 2.5 V reference output voltage. This node must be buffered if required to drive external loads.", 24 VOUTB (out) "Voltage outputs from the DACs. Fixed output voltage range of 0 V to 4.095 V with 1 mV/LSB. An internal temperature stabilized reference maintains a fixed full-scale voltage independent of time, temperature and power supply (See Datasheet)"

## AD8597ACPZ-R2
designator U?
Single Channel Wide Bandwidth Operational Amplifier, 10 MHz BW, 16 V/us SR, Industrial, 8-pin QFN (CP-8-2), Reel; Generic Part Number: AD8597; PartNumber: AD8597ACPZ-R2; Amplifiers Per Package: 1; Input Bias Current: 25nA; Input Offset Voltage: 10uV; Iq/Amp: 5mA; Slew Rate: 16V/us; Small Signal Bandwidth: 10MHz; V Span Max: 36V; V Span Min: 10V; DatasheetVersion: Rev. C; PackageVersion: 061507-B; PackageReference: CP-8-2; PackageDescription: 8-Pin Lead Frame Chip Scale Package, Body 3 x 3 mm, Pitch 0.5 mm; Supplier Part Number 1: AD8597ACPZ-R2-ND; Supplier Part Number 2: 11R1053; Mounting Technology: Surface Mount; ComponentLink1Description: Manufacturer URL; ComponentLink2Description: Datasheet; ComponentLink3Description: Package Specification; ComponentLink4Description: Reference Circuit
footprint DFN8_0.5-PAD(3X3) (Footprint not found)
part A pins: 2 -IN (in), 3 +IN (in), 4 -V (power), 6 OUT (out), 7 +V (power), 9 EP (power)
part B pins: 1 NC, 5 NC, 8 NC

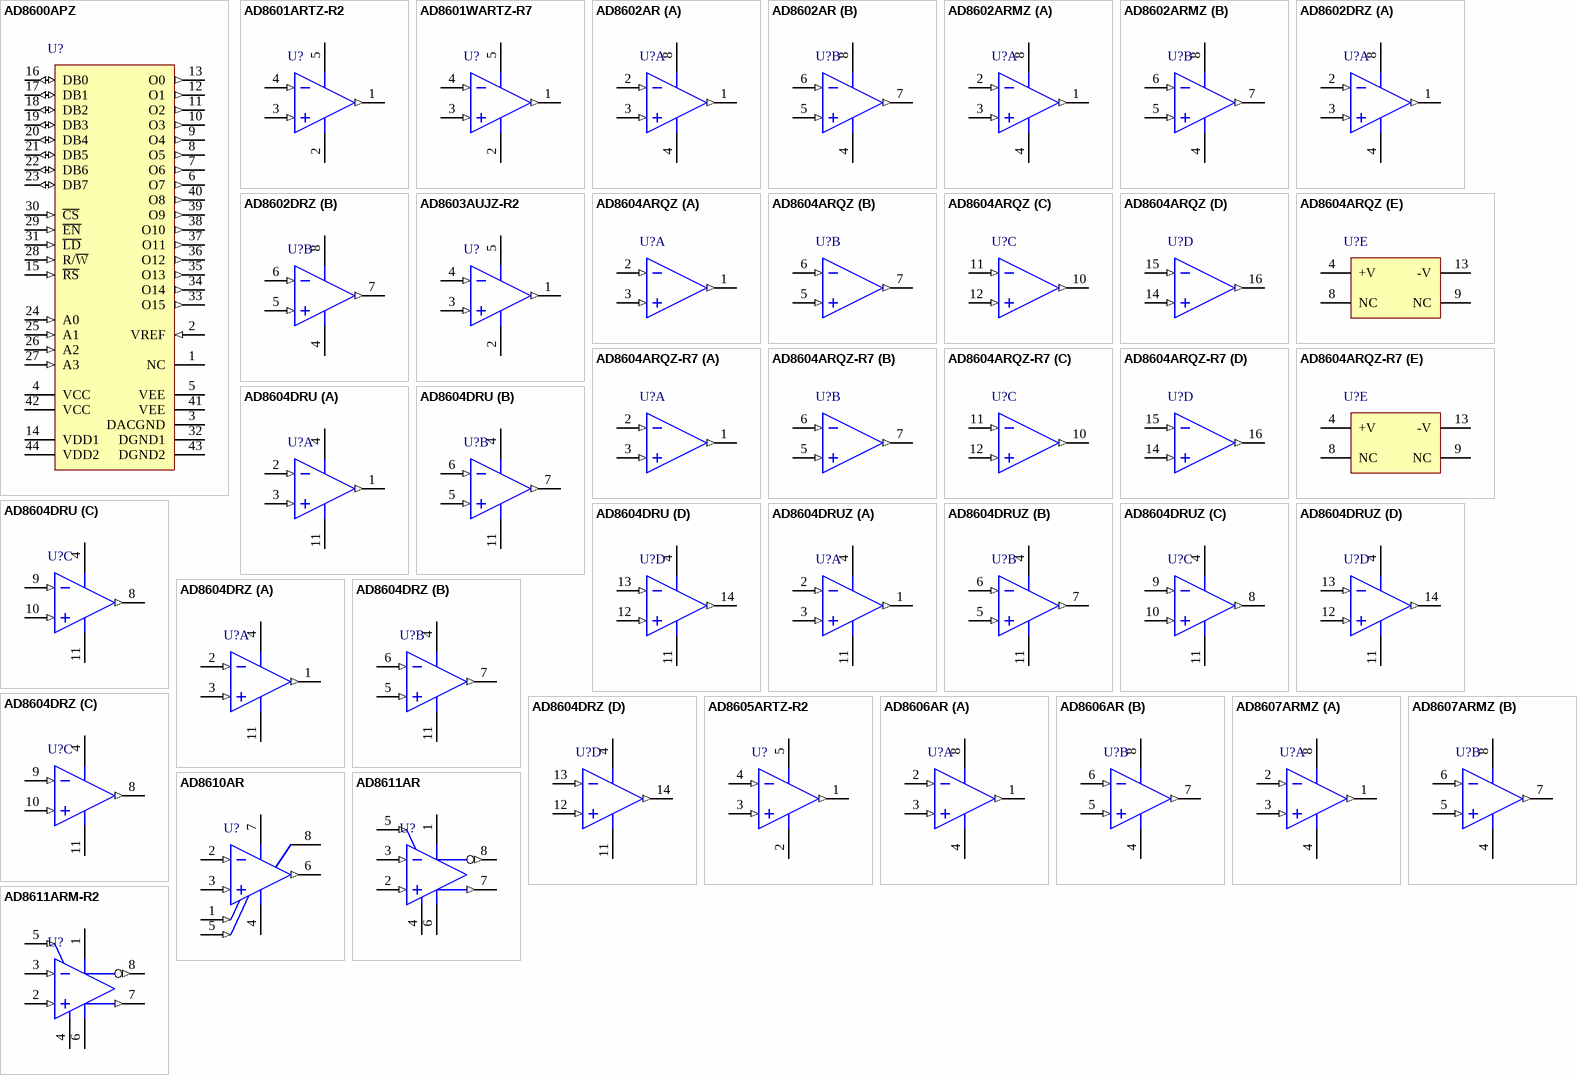
[diagram p97: symbols AD8600APZ to AD8611ARM-R2]

## AD8600APZ
designator U?
16 Channel 8-Bit Multiplying Digital-to-Analog Converter, -40 to +85 degC, P-44A, Pb-Free, Tube; Generic Part Number: AD8600; PartNumber: AD8600APZ; # DAC Outputs: 16; Max V+: 7V; Op Pwr Diss: 350mW; Resolution (Bits): 8; Settling Time: 1祍; Single Supply: Yes; DatasheetVersion: Rev.0; PackageVersion: 2003; PackageReference: P-44A; PackageDescription: 44-Lead Plastic Leaded Chip Carrier [PLCC]; Supplier Part Number 1: AD8600APZ-ND; Supplier Part Number 2: 59K6886; Packing: Tube; RoHS: Y; Mounting Technology: Surface Mount; Code_JEDEC: MO-047-AC; Code_IPC: PLCC-44; ComponentLink1Description: Manufacturer URL; ComponentLink2Description: Datasheet; ComponentLink3Description: Package Specification; ComponentLink4Description: Product URL
footprint PLCC-44N (Footprint not found)
pins: 1 NC "No Connection", 2 VREF (in) "Reference input voltage common to all DACs.", 3 DACGND (power) "DAC Analog Ground Return. Sets analog zero-scale voltage.", 4 VCC (power) "Output Amplifier Positive Supply", 5 VEE (power) "Output Amplifier Negative Supply", 6 O7 (out) "DAC Channel Output No. 7", 7 O6 (out) "DAC Channel Output No. 6", 8 O5 (out) "DAC Channel Output No. 5", 9 O4 (out) "DAC Channel Output No. 4", 10 O3 (out) "DAC Channel Output No. 3", 11 O2 (out) "DAC Channel Output No. 2", 12 O1 (out) "DAC Channel Output No. 1", 13 O0 (out) "DAC Channel Output No. 0", 14 VDD1 (power) "Digital Logic Power Supply", 15 ~{RS} (in) "Active Low Reset Input Pin", 16 DB0 (io) "Data Bit Zero I/O (LSB)", 17 DB1 (io) "Data Bit I/O", 18 DB2 (io) "Data Bit I/O", 19 DB3 (io) "Data Bit I/O", 20 DB4 (io) "Data Bit I/O", 21 DB5 (io) "Data Bit I/O", 22 DB6 (io) "Data Bit I/O", 23 DB7 (io) "Most Significant Data Bit I/O (MSB)", 24 A0 (in) "Address Bit Zero (LSB)", 25 A1 (in) "Address Bit", 26 A2 (in) "Address Bit", 27 A3 (in) "Most Significant Addr Bit (MSB)", 28 R/~{W} (in) "Read/Write Select Control Input", 29 ~{EN} (in) "Active Low Enable Clock Strobe", 30 ~{CS} (in) "Chip Select Input", 31 ~{LD} (in) "DAC Register Load Strobe", 32 DGND1 (power) "Digital Ground Input No. 1", 33 O15 (out) "DAC Channel Output No. 15", 34 O14 (out) "DAC Channel Output No. 14", 35 O13 (out) "DAC Channel Output No. 13", 36 O12 (out) "DAC Channel Output No. 12", 37 O11 (out) "DAC Channel Output No. 11", 38 O10 (out) "DAC Channel Output No. 10", 39 O9 (out) "DAC Channel Output No. 9", 40 O8 (out) "DAC Channel Output No. 8", 41 VEE (power) "Output Amplifier Negative Supply", 42 VCC (power) "Output Amplifier Positive Supply", 43 DGND2 (power) "Digital Ground Input No. 2", 44 VDD2 (power) "DAC Analog Supply Voltage"